# Altium footprint library sun_library.PcbLib: 412 footprints (part 12 of 26)
Each footprint in its own frame and in the unit in brackets; x right, y up, seen from the top. Pads: shape width x height; smd on the part's side, far side on the other; paste and mask are expansions set on the pad; w line width, h text height; cw(c..) or ccw(c..) is an arc to the next point about the centre after c.
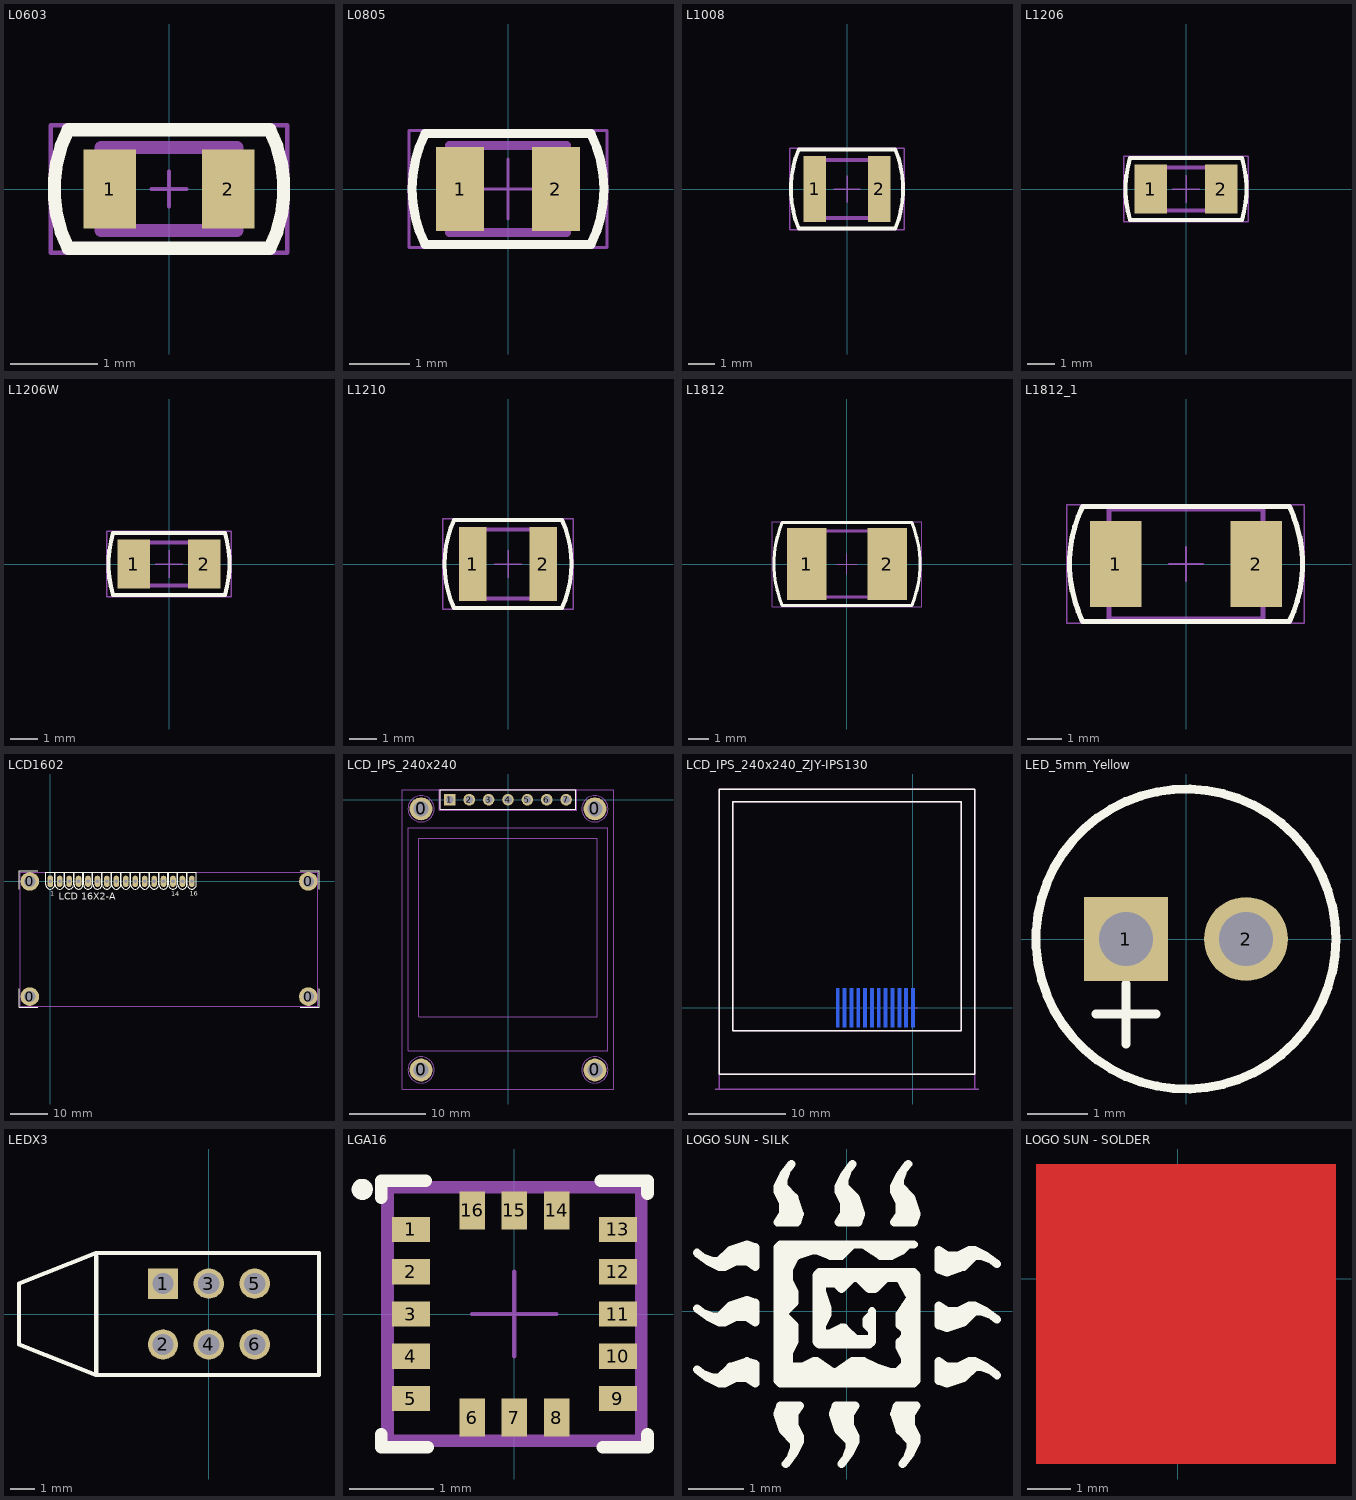
[diagram p11: the footprints below, top view; thin cyan lines are the x and y axes]

## L0603 [mm]
pads (2):
  rect 0.6x0.9 smd paste-0.5: 1(-0.675,0) 2(0.675,0)
Top Overlay:
  lines w0.15: -1.154,-0.671 cw(c0.2,0) -1.154,0.671 ; -1.15,-0.675 1.15,-0.675 ; -1.15,0.675 1.15,0.675 ; 1.154,-0.671 ccw(c-0.2,0) 1.154,0.671
Top Paste:
  region: 0.744,0.432 0.7,0.432 0.616,0.411 0.539,0.37 0.474,0.311 0.45,0.275 0.431,0.252 0.403,0.201 0.383,0.146 0.373,0.088 0.373,0.058 0.373,-0.059 0.373,-0.089 0.383,-0.146 0.403,-0.201 0.432,-0.252 0.45,-0.275 0.474,-0.311 0.539,-0.37 0.616,-0.411 0.7,-0.432 0.744,-0.432 0.975,-0.432 0.975,0.432
  region: -0.744,-0.432 -0.7,-0.432 -0.616,-0.411 -0.539,-0.37 -0.474,-0.311 -0.45,-0.275 -0.431,-0.252 -0.403,-0.201 -0.383,-0.146 -0.373,-0.088 -0.373,-0.058 -0.373,0.059 -0.373,0.089 -0.383,0.146 -0.403,0.201 -0.432,0.252 -0.45,0.275 -0.474,0.311 -0.539,0.37 -0.616,0.411 -0.7,0.432 -0.744,0.432 -0.975,0.432 -0.975,-0.432
TopAssy 13:
  region: -0.775,0.4 -0.7,0.4 -0.7,-0.4 -0.775,-0.4
  region: 0.7,0.4 0.775,0.4 0.775,-0.4 0.7,-0.4
  lines w0.15: -0.775,-0.475 -0.775,0.475 0.775,0.475 0.775,-0.475 -0.775,-0.475
CourtTop 15:
  lines w0.05: -0.2,0 0.2,0 ; 0,-0.2 0,0.2 ; -1.35,-0.725 1.35,-0.725 1.35,0.725 -1.35,0.725 -1.35,-0.725
3D body "L0603chip.step": height 0.95, standoff 0, extent -0.775,-0.4 0.825,0.4

## L0805 [mm]
pads (2):
  rect 0.8x1.4 smd: 1(-0.8,0) 2(0.8,0)
Top Overlay:
  lines w0.15: -1.379,-0.925 cw(c0.45,0) -1.379,0.926 ; -1.379,-0.925 1.378,-0.925 ; -1.378,0.925 1.38,0.925 ; 1.379,-0.926 ccw(c-0.45,0) 1.38,0.923
TopAssy 13:
  lines w0.15: -0.975,-0.725 0.975,-0.725 0.975,0.725 -0.975,0.725 -0.975,-0.725
CourtTop 15:
  lines w0.05: -0.5,0 0.5,0 ; 0,-0.5 0,0.5 ; -1.65,-0.975 -1.65,0.975 1.65,0.975 1.65,-0.975 -1.65,-0.975
3D body "L0805chip.step": height 1.3, standoff 0, extent -1,-0.6 1,0.6

## L1008 [mm]
pads (2):
  rect 0.85x2.5 smd: 1(-1.22,0) 2(1.225,0)
Top Overlay:
  lines w0.15: -1.824,-1.5 cw(c1.775,0) -1.824,1.5 1.824,1.5 cw(c-1.775,0) 1.824,-1.5 -1.824,-1.5
TopAssy 13:
  region: -1.25,1.1 -1.025,1.1 -1.025,-1.1 -1.25,-1.1
  region: 1,1.1 1.25,1.1 1.25,-1.1 1,-1.1
  lines w0.15: -1.25,-1.1 1.25,-1.1 1.25,1.1 -1.25,1.1 -1.25,-1.1
CourtTop 15:
  lines w0.05: -0.5,0 0.5,0 ; 0,-0.5 0,0.5 ; -2.175,-1.55 2.175,-1.55 2.175,1.55 -2.175,1.55 -2.175,-1.55
3D body "User Library-Chip Inductor1008.step": height 2, standoff 0, extent -1.25,-1.1 1.25,1.1

## L1206 [mm]
pads (2):
  rect 1.2x1.8 smd: 1(-1.3,0) 2(1.3,0)
Top Overlay:
  lines w0.15: -2.065,-1.15 2.064,-1.15 ; -2.065,-1.143 cw(c1.65,0) -2.064,1.148 ; -2.064,1.15 2.063,1.15 ; 2.063,1.151 cw(c-1.65,0) 2.064,-1.148
TopAssy 13:
  region: -1.6,0.8 -1.5,0.8 -1.5,-0.8 -1.6,-0.8
  region: 1.45,0.8 1.6,0.8 1.6,-0.8 1.45,-0.8
  lines w0.15: -1.6,-0.8 1.6,-0.8 1.6,0.8 -1.6,0.8 -1.6,-0.8
CourtTop 15:
  lines w0.05: -0.5,0 0.5,0 ; 0,-0.5 0,0.5 ; -2.3,-1.2 -2.3,1.2 2.3,1.2 2.3,-1.2 -2.3,-1.2
3D body "L1206chip.step": height 1, standoff 0, extent -1.664,-0.8 1.536,0.8

## L1206W [mm]
pads (2):
  rect 1.2x1.8 smd: 1(-1.3,0) 2(1.3,0)
Top Overlay:
  lines w0.15: -2.065,-1.15 2.064,-1.15 ; -2.065,-1.143 cw(c1.65,0) -2.064,1.148 ; -2.064,1.15 2.063,1.15 ; 2.063,1.151 cw(c-1.65,0) 2.064,-1.148
TopAssy 13:
  region: 1.45,0.8 1.6,0.8 1.6,-0.8 1.45,-0.8
  region: -1.6,0.8 -1.475,0.8 -1.475,-0.8 -1.6,-0.8
  lines w0.15: -1.6,-0.8 -1.6,0.8 1.6,0.8 1.6,-0.8 -1.6,-0.8
CourtTop 15:
  lines w0.05: -0.5,0 0.5,0 ; 0,-0.5 0,0.5 ; -2.3,-1.2 -2.3,1.2 2.3,1.2 2.3,-1.2 -2.3,-1.2
3D body "SW3dPS-FER1206.STEP": height 1.81, standoff -0.4, extent -1.664,-0.8 1.664,0.8

## L1210 [mm]
pads (2):
  rect 1x2.7 smd: 1(-1.288,0) 2(1.288,0)
Top Overlay:
  lines w0.15: -1.97,1.595 ccw(c1.575,0) -1.967,-1.601 1.97,-1.6 ; -1.97,1.6 1.966,1.6 ; 1.967,1.6 cw(c-1.575,0) 1.97,-1.594
TopAssy 13:
  lines w0.15: -1.587,-1.25 1.612,-1.25 1.612,1.25 -1.587,1.25 -1.587,-1.25
  text ".Designator" at -1,-0.425 h1.34
CourtTop 15:
  lines w0.05: -0.5,0 0.5,0 ; 0,-0.5 0,0.5 ; -2.375,-1.65 -2.375,1.65 2.375,1.65 2.375,-1.65 -2.375,-1.65
3D body "User Library-Chip Inductor1210.step": height 1.35, standoff 0, extent -1.6,-1.25 1.6,1.25

## L1812 [mm]
pads (2):
  rect 1.9x3.5 smd: 1(-1.95,0) 2(1.95,0)
Top Overlay:
  lines w0.15: -3.141,1.998 ccw(c1.861,0.002) -3.141,-1.996 ; -3.141,2 3.141,2 ; -3.141,-2 3.141,-2 ; 3.141,1.996 cw(c-1.861,-0.002) 3.141,-1.998
TopAssy 13:
  lines w0.15: -2.25,-1.6 -2.25,1.6 2.25,1.6 2.25,-1.6 -2.25,-1.6
CourtTop 15:
  lines w0.05: -0.5,0 0.5,0 ; 0,-0.5 0,0.5 ; -3.6,-2.075 3.6,-2.075 3.6,2.05 -3.6,2.05 -3.6,-2.075
3D body "User Library-Chip Inductor1812.step": height 1.75, standoff 0, extent -2.25,-1.6 2.25,1.6

## L1812_1 [mm]
pads (2):
  rect 1.5x2.5 smd: 1(-2.05,0) 2(2.05,0)
Top Overlay:
  lines w0.15: -3.021,1.673 ccw(c0.489,0.002) -3.018,-1.676 ; -3.021,1.675 3.017,1.675 ; -3.017,-1.675 3.021,-1.675 ; 3.017,1.678 cw(c-0.489,-0.002) 3.021,-1.673
TopAssy 13:
  lines w0.15: -2.25,-1.6 2.25,-1.6 2.25,1.6 -2.25,1.6 -2.25,-1.6
CourtTop 15:
  lines w0.05: -0.5,0 0.5,0 ; 0,-0.5 0,0.5 ; -3.475,-1.725 -3.475,1.725 3.45,1.725 3.45,-1.725 -3.475,-1.725
3D body "L1812_4532.STEP": height 3.24, standoff -0.09, extent -2.3,-1.6 2.2,1.6

## LCD1602 [mil]
pads (20):
  round 196.85 hole 118.11: 0(-216.54,-1220) 0(-216.54,0) 0(2733.46,-1220) 0(2733.46,0)
  oct 60x120 hole 39.37: 1(0,0)
  oval 60x120 hole 39.37: 2(100,0) 3(200,0) 4(300,0) 5(400,0) 6(500,0) 7(600,0) 8(700,0) 9(800,0) 10(900,0) 11(1000,0) 12(1100,0) 13(1200,0) 14(1300,0) 15(1400,0) 16(1500,0)
Top Overlay:
  circle w5.91: c2734.64,0 r49.21
  circle w5.91: c-218.12,0 r49.21
  circle w5.91: c2734.64,-1220.5 r49.21
  circle w5.91: c-218.12,-1220.5 r49.21
  lines w5.91: -330.71,-1137.8 -330.71,-1334.65 -133.86,-1334.65 ; -330.71,-82.68 -330.71,114.17 -133.86,114.17 ; -47.24,-37.12 -47.24,98.4 1547.24,98.4 ; -46.96,-37.12 ccw(c0,-35.43) 46.96,-36.86 ; 46.81,-36.86 46.81,98.4 ; 52.76,-37.12 52.76,98.4 ; 53.04,-37.12 ccw(c100,-35.43) 146.96,-36.86 ; 146.81,-36.86 146.81,98.4 ; 152.76,-37.12 152.76,98.4 ; 153.04,-37.12 ccw(c200,-35.43) 246.96,-36.86 ; 246.81,-36.86 246.81,98.4 ; 252.76,-37.12 252.76,98.4 ; 253.04,-37.12 ccw(c300,-35.43) 346.96,-36.86 ; 346.81,-36.86 346.81,98.4 ; 352.76,-37.12 352.76,98.4 ; 353.04,-37.12 ccw(c400,-35.43) 446.96,-36.86 ; 446.81,-36.86 446.81,98.4 ; 452.76,-37.12 452.76,98.4 ; 453.04,-37.12 ccw(c500,-35.43) 546.96,-36.86 ; 546.81,-36.86 546.81,98.4 ; 552.76,-37.12 552.76,98.4 ; 553.04,-37.12 ccw(c600,-35.43) 646.96,-36.86 ; 646.81,-36.86 646.81,98.4 ; 652.76,-37.12 652.76,98.4 ; 653.04,-37.12 ccw(c700,-35.43) 746.96,-36.86 ; 746.81,-36.86 746.81,98.4 ; 752.76,-37.12 752.76,98.4 ; 753.04,-37.12 ccw(c800,-35.43) 846.96,-36.86 ; 846.81,-36.86 846.81,98.4 ; 852.76,-37.12 852.76,98.4 ; 853.04,-37.12 ccw(c900,-35.43) 946.96,-36.86 ; 946.81,-36.86 946.81,98.4 ; 952.76,-37.12 952.76,98.4 ; 953.04,-37.12 ccw(c1000,-35.43) 1046.96,-36.86 ; 1046.81,-36.86 1046.81,98.4 ; 1052.76,-37.12 1052.76,98.4 ; 1053.04,-37.12 ccw(c1100,-35.43) 1146.96,-36.86 ; 1146.81,-36.86 1146.81,98.4 ; 1152.76,-37.12 1152.76,98.4 ; 1153.04,-37.12 ccw(c1200,-35.43) 1246.96,-36.86 ; 1246.81,-36.86 1246.81,98.4 ; 1252.76,-37.12 1252.76,98.4 ; 1253.04,-37.12 ccw(c1300,-35.43) 1346.96,-36.86 ; 1346.81,-36.86 1346.81,98.4 ; 1352.76,-37.12 1352.76,98.4 ; 1353.04,-37.12 ccw(c1400,-35.43) 1446.96,-36.86 ; 1446.81,-36.86 1446.81,98.4 ; 1452.76,-37.12 1452.76,98.4 ; 1453.04,-37.12 ccw(c1500,-35.43) 1546.96,-36.86 ; 1546.81,-36.86 1546.81,98.4 ; 2649.61,-1334.65 2846.46,-1334.65 2846.46,-1137.8 ; 2649.61,114.17 2846.46,114.17 2846.46,-82.68
  text "LCD 16X2-A" at 90.55,-196.85 h75
  text "14" at 1280,-160 h50
  text "1" at 0,-150 h50
  text "16" at 1480,-150 h50
TopAssy 13:
  lines w5.91: -318.9,-1321.57 2834.1,-1321.57 2834.1,98.43 -318.9,98.43 -318.9,-1321.57
3D body "User Library-LCD-5.STEP": height 496.06, standoff -224.41, extent -318.9,-1318.9 2830.71,98.43
3D body "User Library-M3x0_5xL Phillips Panhead Screw.step": height 274.83, standoff -133.86, extent -326.77,-1330.23 -106.29,-1109.76
3D body "User Library-nyloc nut, st stl a2 iso.step": height -19.68, standoff -177.17, extent -341.55,-1318.9 -91.52,-1102.36
3D body "User Library-nyloc nut, st stl a2 iso.step": height -19.68, standoff -177.17, extent 2608.45,-1318.9 2858.48,-1102.36
3D body "User Library-M3x0_5xL Phillips Panhead Screw.step": height 274.83, standoff -133.86, extent 2623.23,-1330.23 2843.71,-1109.76
3D body "User Library-nyloc nut, st stl a2 iso.step": height -19.68, standoff -177.17, extent 2608.45,-98.9 2858.48,117.64
3D body "User Library-M3x0_5xL Phillips Panhead Screw.step": height 274.83, standoff -133.86, extent 2623.23,-110.23 2843.71,110.24
3D body "User Library-nyloc nut, st stl a2 iso.step": height -19.68, standoff -177.17, extent -341.55,-98.9 -91.52,117.64
3D body "User Library-M3x0_5xL Phillips Panhead Screw.step": height 274.83, standoff -133.86, extent -326.77,-110.23 -106.29,110.24

## LCD_IPS_240x240 [mm] "LCD IPS Displey 1,3\" 240 x 240 pixel SPI Interface"
height 6
pads (11):
  round 3 hole 2: 0(-11.39,-35.42) 0(-11.39,-1.2) 0(11.39,-35.42) 0(11.39,-1.2)
  rect 1.51x1.51 hole 1: 1(-7.62,0)
  round 1.51 hole 1: 2(-5.08,0) 3(-2.54,0) 4(0,0) 5(2.54,0) 6(5.08,0) 7(7.62,0)
Top Overlay:
  lines w0.15: -8.885,-1.281 8.885,-1.281 8.885,1.281 -8.885,1.281 -8.885,-1.281
TopAssy 13:
  circle w0.15: c11.39,-35.42 r1.722
  circle w0.15: c-11.39,-35.42 r1.722
  circle w0.15: c-11.39,-1.2 r1.722
  circle w0.15: c11.39,-1.2 r1.722
  lines w0.15: -13.89,-37.92 -13.89,1.3 13.89,1.3 13.89,-37.92 -13.89,-37.92 ; -13.08,-32.92 -13.08,-3.7 0,-3.7 13.08,-3.7 13.08,-32.92 0,-32.92 -13.08,-32.92 ; -11.7,-28.43 -11.7,-5.03 0,-5.03 11.7,-5.03 11.7,-28.43 0,-28.43 -11.7,-28.43 ; -8.885,-1.281 8.885,-1.281 8.885,1.281 -8.885,1.281 -8.885,-1.281 ; -8.005,-0.375 -7.205,-0.375 -7.205,0.4 -8.005,0.4 -8.005,-0.375
CourtTop 15:
  lines w0.05: -0.5,0 0.5,0 ; 0,-0.5 0,0.5 ; -9.01,-1.4 9.01,-1.4 9.01,1.4 -9.01,1.4 -9.01,-1.4
3D body: height 4.1, standoff 2.4, extent 9.902,-36.917 12.89,-33.923
3D body: height 4.1, standoff 2.4, extent -12.878,-36.917 -9.89,-33.923
3D body: height 4.1, standoff 2.4, extent -12.878,-2.697 -9.89,0.297
3D body: height 4.1, standoff 2.4, extent 9.902,-2.697 12.89,0.297
3D body "User Library-PLS-1.step": height 5.6, standoff -5.84, extent 1.27,-1.27 3.81,1.27
3D body "User Library-PLS-1.step": height 5.6, standoff -5.84, extent 3.81,-1.27 6.35,1.27
3D body "User Library-PLS-1.step": height 5.6, standoff -5.84, extent 6.35,-1.27 8.89,1.27
3D body "User Library-PLS-1.step": height 5.6, standoff -5.84, extent -1.27,-1.27 1.27,1.27
3D body "User Library-PLS-1.step": height 5.6, standoff -5.84, extent -3.81,-1.27 -1.27,1.27
3D body "User Library-PLS-1.step": height 5.6, standoff -5.84, extent -6.35,-1.27 -3.81,1.27
3D body "User Library-PLS-1.step": height 5.6, standoff -5.84, extent -8.89,-1.27 -6.35,1.27
3D body: height 5.6, standoff 5.5, extent -11.7,-28.43 11.7,-5.03
3D body: height 5.5, standoff 4, extent -13.08,-32.92 13.08,-3.7
3D body: height 4, standoff 2.5, extent -13.89,-37.92 13.89,1.3

## LCD_IPS_240x240_ZJY-IPS130 [mm] "LCD IPS Displey 1,3\" 240 x 240 pixel SPI Interface"
height 3
pads (12):
  rect 0.35x4 smd far side: 1(0,0) 2(-0.7,0) 3(-1.4,0) 4(-2.1,0) 5(-2.8,0) 6(-3.5,0) 7(-4.2,0) 8(-4.9,0) 9(-5.6,0) 10(-6.3,0) 11(-7,0) 12(-7.7,0)
Top Overlay:
  lines w0.15: -19.855,-6.82 -19.855,22.4 6.305,22.4 6.305,-6.82 -19.855,-6.82 ; -18.475,-2.33 -6.775,-2.33 4.925,-2.33 4.925,21.07 -6.775,21.07 -18.475,21.07 -18.475,-2.33
Bottom Overlay:
  circle w0.5: c1.445,-2.82 r0.25
  circle w0.5: c-8.555,-2.82 r0.25
  lines w0.15: -9.555,-6.82 -9.555,1.18 -8.255,1.18 ; 0.545,1.18 1.845,1.18 1.845,-1.82
  text "12" at -9.565,2.41 h0.85
  text "1" at 0.695,2.41 h0.85
TopAssy 13:
  lines w0.15: -19.855,-6.82 -19.855,22.4 -6.775,22.4 6.305,22.4 6.305,-6.82 -6.775,-6.82 -19.855,-6.82 ; -18.475,-2.33 -18.475,21.07 -6.775,21.07 4.925,21.07 4.925,-2.33 -6.775,-2.33 -18.475,-2.33
CourtTop 15:
  lines w0.05: -0.5,0 0.5,0 ; 0,-0.5 0,0.5
  lines w0.15: -20.255,-8.32 6.745,-8.32 ; -19.855,-8.32 -19.855,22.4 6.305,22.4 6.305,-8.32 -19.855,-8.32
  text "Edge board" at -9.425,-7.8 h0.85
3D body: height 2.5, standoff 0, extent -19.855,-6.82 6.305,22.4
3D body: height 2.6, standoff 2.5, extent -18.475,-2.33 4.925,21.07

## LED_5mm_Yellow [mm] "LED_5mm_Yellow"
pads (2):
  rect 1.4x1.4 hole 0.9: 1(-1,0)
  round 1.4 hole 0.9: 2(1,0)
Top Overlay:
  circle w0.15: c0,0 r2.5
  lines w0.15: -1.5,-1.25 -0.5,-1.25 ; -1,-1.75 -1,-0.75

## LEDX3 [mil]
pads (6):
  rect 50x50 / inner round 50 / far side rect 50x50 hole 35: 1(-75.2,50)
  round 50 hole 35: 2(-75.2,-50) 3(0,50) 4(0,-50) 5(75.2,50) 6(75.2,-50)
Top Overlay:
  lines w7: -184.84,-99.21 -184.84,94.88 ; -311.42,-50 -311.42,50 -185.04,100 180.71,100 180.71,-100 -185.04,-100 -311.42,-50
3D body "934SA.STEP": height 600.5, standoff -137.3, extent -353.54,-85.04 199.61,85.04

## LGA16 [mm] "LGA, 14-Leads, Body 3x3x1mm, Pitch 0.5mm"
height 1
pads (16):
  rect 0.45x0.3 smd paste-0.05 mask-1: 1(-1.225,1) 2(-1.225,0.5) 3(-1.225,0) 4(-1.225,-0.5) 5(-1.225,-1) 9(1.225,-1) 10(1.225,-0.5) 11(1.225,0) 12(1.225,0.5) 13(1.225,1)
  rect 0.3x0.45 smd paste-0.05 mask-1: 6(-0.5,-1.225) 7(0,-1.225) 8(0.5,-1.225) 14(0.5,1.225) 15(0,1.225) 16(-0.5,1.225)
Top Overlay:
  circle w0.15: c-1.8,1.475 r0.05
  lines w0.15: -1.575,-1.425 -1.575,-1.575 -1.025,-1.575 ; -1.575,1.375 -1.575,1.575 -1.05,1.575 ; 1.025,1.575 1.575,1.575 1.575,1.425 ; 1.05,-1.575 1.575,-1.575 1.575,-1.425
Top Solder:
  region: 0.3,-0.95 0.3,-1.7 0.7,-1.7 0.7,-0.95
  region: -0.2,-0.95 -0.2,-1.7 0.2,-1.7 0.2,-0.95
  region: -0.7,-0.95 -0.7,-1.7 -0.3,-1.7 -0.3,-0.95
  region: -0.3,0.95 -0.3,1.7 -0.7,1.7 -0.7,0.95
  region: 0.2,0.95 0.2,1.7 -0.2,1.7 -0.2,0.95
  region: 0.7,0.95 0.7,1.7 0.3,1.7 0.3,0.95
  rectangle: 0.95,-0.2 1.7,0.2
  rectangle: 0.95,0.3 1.7,0.7
  rectangle: 0.95,0.8 1.7,1.2
  rectangle: 0.95,-0.7 1.7,-0.3
  rectangle: 0.95,-1.2 1.7,-0.8
  region: -0.95,1.2 -1.7,1.2 -1.7,0.8 -0.95,0.8
  region: -0.95,0.7 -1.7,0.7 -1.7,0.3 -0.95,0.3
  region: -0.95,-0.8 -1.7,-0.8 -1.7,-1.2 -0.95,-1.2
  region: -0.95,-0.3 -1.7,-0.3 -1.7,-0.7 -0.95,-0.7
  region: -0.95,0.2 -1.7,0.2 -1.7,-0.2 -0.95,-0.2
TopAssy 13:
  lines w0.15: -1.5,-1.5 1.5,-1.5 1.5,1.5 -1.5,1.5 -1.5,-1.5
CourtTop 15:
  lines w0.05: -0.5,0 0.5,0 ; 0,-0.5 0,0.5 ; -1.55,-1.55 1.55,-1.55 1.55,1.55 -1.55,1.55 -1.55,-1.55
3D body "User Library-LIS331AL.step": height 1.01, standoff -0.01, extent -1.5,-1.5 1.5,1.5

## LOGO SUN - SILK [mm]
Top Overlay:
  drawing of 666 lines, arcs and shapes, not listed

## LOGO SUN - SOLDER [mm]
Top:
  rectangle: -3.25,-4.25 3.625,2.625
Top Solder:
  drawing of 670 lines, arcs and shapes, not listed